# Altium footprint library Package_DFN_QFN.PcbLib: 557 footprints (part 30 of 35)
Each footprint in its own frame and in the unit in brackets; x right, y up, seen from the top. Pads: shape width x height; smd on the part's side, far side on the other; paste and mask are expansions set on the pad; w line width, h text height; cw(c..) or ccw(c..) is an arc to the next point about the centre after c.
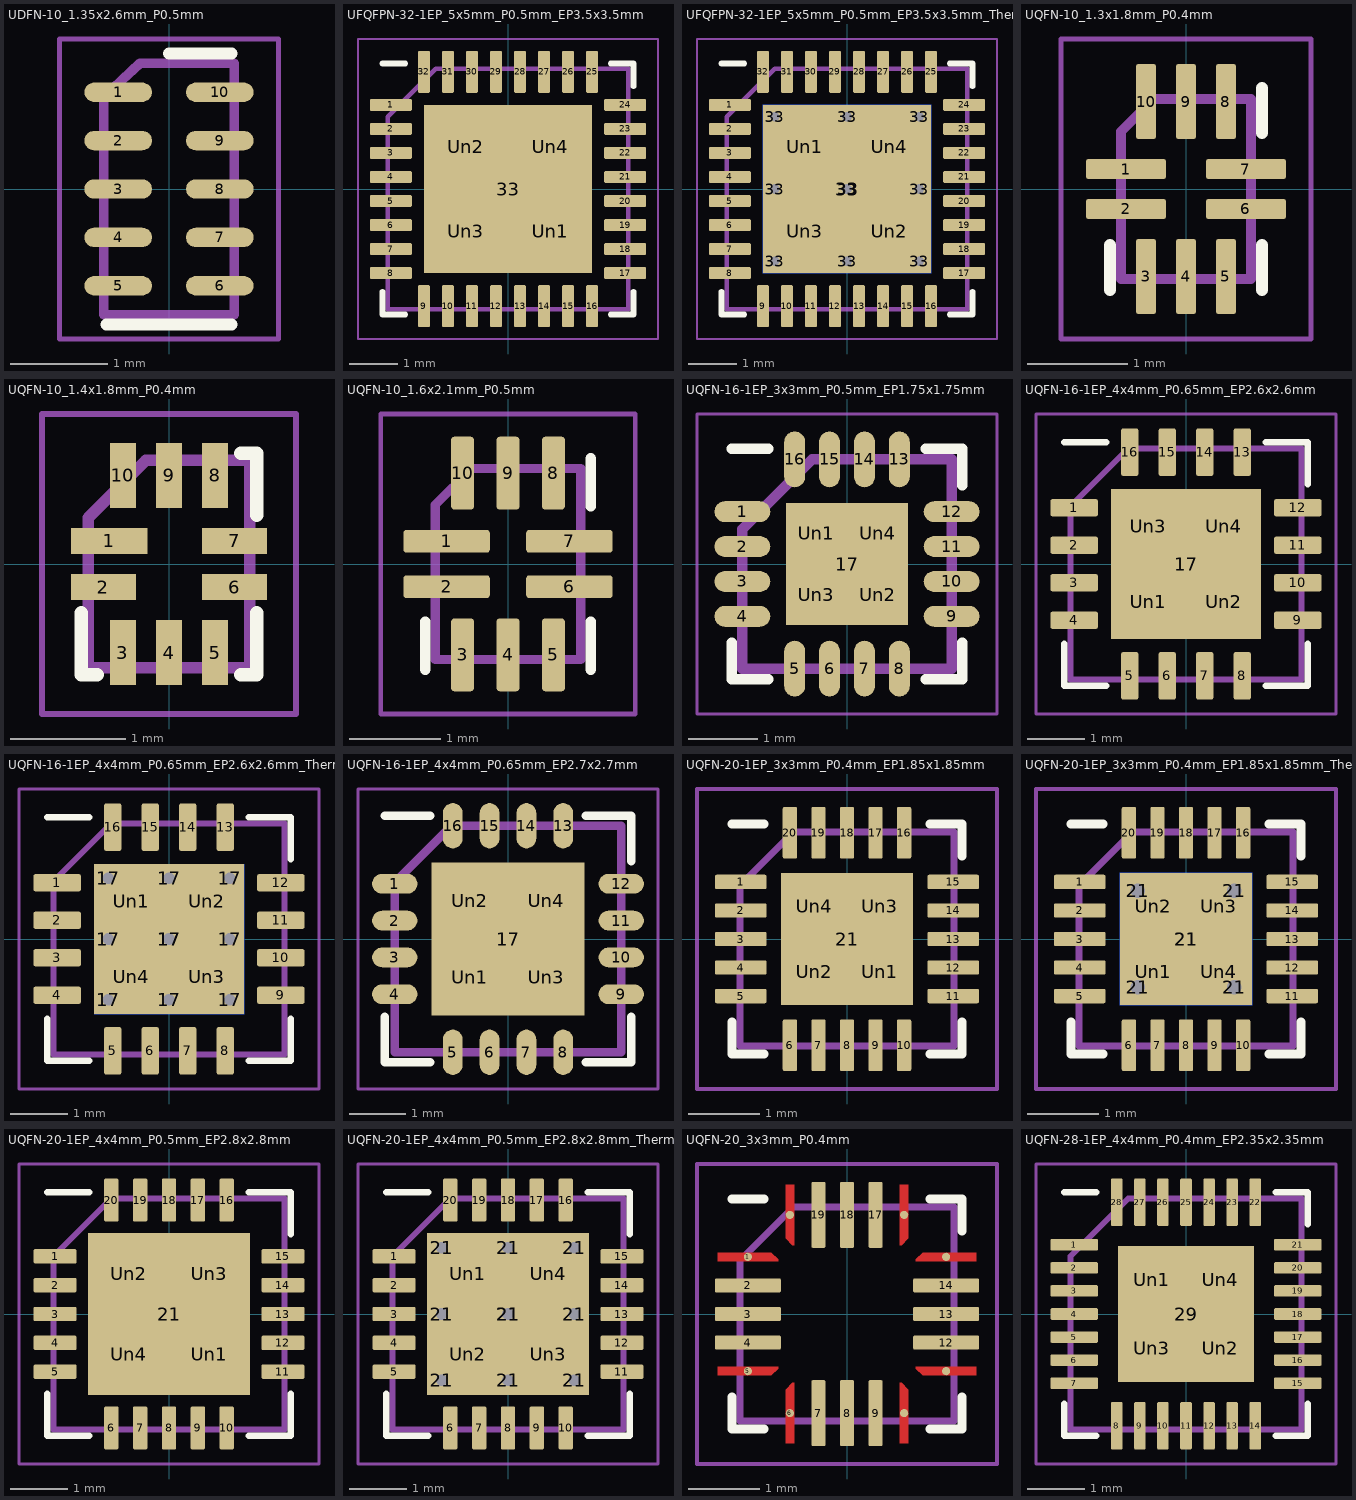
[diagram p29: the footprints below, top view; thin cyan lines are the x and y axes]

## UDFN-10_1.35x2.6mm_P0.5mm [mm]
pads (10):
  rrect100% 0.7x0.2 smd: 1(-0.525,1) 2(-0.525,0.5) 3(-0.525,0) 4(-0.525,-0.5) 5(-0.525,-1) 6(0.525,-1) 7(0.525,-0.5) 8(0.525,0) 9(0.525,0.5) 10(0.525,1)
F.SilkS:
  lines w0.12: -0.65,-1.4 0.65,-1.4 ; 0,1.4 0.65,1.4
F.CrtYd:
  lines w0.05: -1.13,-1.55 1.13,-1.55 1.13,1.55 -1.13,1.55 -1.13,-1.55
F.Fab:
  lines w0.1: -0.675,-1.3 -0.675,0.95 -0.3,1.3 0.675,1.3 0.675,-1.3 -0.675,-1.3
  text "'.Designator'" at 0.42,-2.023 h0.5

## UFQFPN-32-1EP_5x5mm_P0.5mm_EP3.5x3.5mm [mm]
pads (37):
  rrect25% 0.875x0.25 smd: 1(-2.438,1.75) 2(-2.438,1.25) 3(-2.438,0.75) 4(-2.438,0.25) 5(-2.438,-0.25) 6(-2.438,-0.75) 7(-2.438,-1.25) 8(-2.438,-1.75) 17(2.438,-1.75) 18(2.438,-1.25) 19(2.438,-0.75) 20(2.438,-0.25) 21(2.438,0.25) 22(2.438,0.75) 23(2.438,1.25) 24(2.438,1.75)
  rrect25% 0.25x0.875 smd: 9(-1.75,-2.438) 10(-1.25,-2.438) 11(-0.75,-2.438) 12(-0.25,-2.438) 13(0.25,-2.438) 14(0.75,-2.438) 15(1.25,-2.438) 16(1.75,-2.438) 25(1.75,2.438) 26(1.25,2.438) 27(0.75,2.438) 28(0.25,2.438) 29(-0.25,2.438) 30(-0.75,2.438) 31(-1.25,2.438) 32(-1.75,2.438)
  rect 3.5x3.5 smd: 33(0,0)
  rrect18% 1.41x1.41 on Top Paste: Un1(0.875,-0.875) Un2(-0.875,0.875) Un3(-0.875,-0.875) Un4(0.875,0.875)
F.SilkS:
  lines w0.12: -2.61,-2.135 -2.61,-2.61 -2.135,-2.61 ; -2.61,2.61 -2.135,2.61 ; 2.135,-2.61 2.61,-2.61 2.61,-2.135 ; 2.135,2.61 2.61,2.61 2.61,2.135
F.CrtYd:
  lines w0.05: -3.12,-3.12 3.12,-3.12 3.12,3.12 -3.12,3.12 -3.12,-3.12
F.Fab:
  lines w0.1: -2.5,-2.5 2.5,-2.5 2.5,2.5 -1.5,2.5 -2.5,1.5 -2.5,-2.5
  text "'.Designator'" at -4.047,-0.84 h1

## UFQFPN-32-1EP_5x5mm_P0.5mm_EP3.5x3.5mm_ThermalVias [mm]
pads (47):
  rrect25% 0.875x0.25 smd: 1(-2.438,1.75) 2(-2.438,1.25) 3(-2.438,0.75) 4(-2.438,0.25) 5(-2.438,-0.25) 6(-2.438,-0.75) 7(-2.438,-1.25) 8(-2.438,-1.75) 17(2.438,-1.75) 18(2.438,-1.25) 19(2.438,-0.75) 20(2.438,-0.25) 21(2.438,0.25) 22(2.438,0.75) 23(2.438,1.25) 24(2.438,1.75)
  rrect25% 0.25x0.875 smd: 9(-1.75,-2.438) 10(-1.25,-2.438) 11(-0.75,-2.438) 12(-0.25,-2.438) 13(0.25,-2.438) 14(0.75,-2.438) 15(1.25,-2.438) 16(1.75,-2.438) 25(1.75,2.438) 26(1.25,2.438) 27(0.75,2.438) 28(0.25,2.438) 29(-0.25,2.438) 30(-0.75,2.438) 31(-1.25,2.438) 32(-1.75,2.438)
  round 0.5 hole 0.2: 33(-1.5,-1.5) 33(-1.5,0) 33(-1.5,1.5) 33(0,-1.5) 33(0,0) 33(0,1.5) 33(1.5,-1.5) 33(1.5,0) 33(1.5,1.5)
  rect 3.5x3.5 smd: 33(0,0)
  rect 3.5x3.5 smd far side: 33(0,0)
  rrect18% 1.41x1.41 on Top Paste: Un1(-0.875,0.875) Un2(0.875,-0.875) Un3(-0.875,-0.875) Un4(0.875,0.875)
F.SilkS:
  lines w0.12: -2.61,-2.135 -2.61,-2.61 -2.135,-2.61 ; -2.61,2.61 -2.135,2.61 ; 2.135,-2.61 2.61,-2.61 2.61,-2.135 ; 2.135,2.61 2.61,2.61 2.61,2.135
F.CrtYd:
  lines w0.05: -3.12,-3.12 -3.12,3.12 3.12,3.12 3.12,-3.12 -3.12,-3.12
F.Fab:
  lines w0.1: -2.5,-2.5 2.5,-2.5 2.5,2.5 -1.5,2.5 -2.5,1.5 -2.5,-2.5
  text "'.Designator'" at -4.047,-0.84 h1

## UQFN-10_1.3x1.8mm_P0.4mm [mm]
pads (10):
  rrect25% 0.8x0.2 smd: 1(-0.6,0.2) 2(-0.6,-0.2) 6(0.6,-0.2) 7(0.6,0.2)
  rrect25% 0.2x0.75 smd: 3(-0.4,-0.875) 4(0,-0.875) 5(0.4,-0.875) 8(0.4,0.875) 9(0,0.875) 10(-0.4,0.875)
F.SilkS:
  lines w0.12: -0.76,-1.01 -0.76,-0.56 ; 0.76,-1.01 0.76,-0.56 ; 0.76,0.56 0.76,1.01
F.CrtYd:
  lines w0.05: -1.25,-1.5 -1.25,1.5 1.25,1.5 1.25,-1.5 -1.25,-1.5
F.Fab:
  lines w0.1: -0.65,-0.9 0.65,-0.9 0.65,0.9 -0.325,0.9 -0.65,0.575 -0.65,-0.9
  text "'.Designator'" at -1.297,-0.271 h0.32

## UQFN-10_1.4x1.8mm_P0.4mm [mm]
pads (10):
  rect 0.663x0.225 smd: 1(-0.519,0.2)
  rect 0.563x0.225 smd: 2(-0.569,-0.2) 6(0.569,-0.2) 7(0.569,0.2)
  rect 0.225x0.563 smd: 3(-0.4,-0.768) 4(0,-0.768) 5(0.4,-0.768) 8(0.4,0.768) 9(0,0.768) 10(-0.4,0.768)
F.SilkS:
  lines w0.12: -0.76,-0.425 -0.76,-0.96 -0.625,-0.96 ; 0.625,-0.96 0.76,-0.96 0.76,-0.425 ; 0.625,0.96 0.76,0.96 0.76,0.425
F.CrtYd:
  lines w0.05: -1.1,-1.3 -1.1,1.3 1.1,1.3 1.1,-1.3 -1.1,-1.3
F.Fab:
  lines w0.1: -0.7,-0.9 0.7,-0.9 0.7,0.9 -0.2,0.9 -0.7,0.4 -0.7,-0.9
  text "'.Designator'" at -1.998,-0.395 h0.5

## UQFN-10_1.6x2.1mm_P0.5mm [mm]
pads (10):
  rrect25% 0.95x0.25 smd: 1(-0.675,0.25) 2(-0.675,-0.25) 6(0.675,-0.25) 7(0.675,0.25)
  rrect25% 0.25x0.8 smd: 3(-0.5,-1) 4(0,-1) 5(0.5,-1) 8(0.5,1) 9(0,1) 10(-0.5,1)
F.SilkS:
  lines w0.12: -0.91,-1.16 -0.91,-0.635 ; 0.91,-1.16 0.91,-0.635 ; 0.91,0.635 0.91,1.16
F.CrtYd:
  lines w0.05: -1.4,-1.65 1.4,-1.65 1.4,1.65 -1.4,1.65 -1.4,-1.65
F.Fab:
  lines w0.1: -0.8,-1.05 -0.8,0.65 -0.4,1.05 0.8,1.05 0.8,-1.05 -0.8,-1.05
  text "'.Designator'" at -1.619,-0.336 h0.4

## UQFN-16-1EP_3x3mm_P0.5mm_EP1.75x1.75mm [mm]
pads (21):
  rrect100% 0.8x0.3 smd: 1(-1.5,0.75) 2(-1.5,0.25) 3(-1.5,-0.25) 4(-1.5,-0.75) 9(1.5,-0.75) 10(1.5,-0.25) 11(1.5,0.25) 12(1.5,0.75)
  rrect100% 0.3x0.8 smd: 5(-0.75,-1.5) 6(-0.25,-1.5) 7(0.25,-1.5) 8(0.75,-1.5) 13(0.75,1.5) 14(0.25,1.5) 15(-0.25,1.5) 16(-0.75,1.5)
  rect 1.75x1.75 smd: 17(0,0)
  rect 0.7x0.7 on Top Paste: Un1(-0.437,0.437) Un2(0.437,-0.437) Un3(-0.437,-0.437) Un4(0.437,0.437)
F.SilkS:
  lines w0.15: -1.65,-1.125 -1.65,-1.65 -1.125,-1.65 ; -1.65,1.65 -1.125,1.65 ; 1.125,-1.65 1.65,-1.65 1.65,-1.125 ; 1.125,1.65 1.65,1.65 1.65,1.125
F.CrtYd:
  lines w0.05: -2.15,-2.15 2.15,-2.15 2.15,2.15 -2.15,2.15 -2.15,-2.15
F.Fab:
  lines w0.15: -1.5,-1.5 1.5,-1.5 1.5,1.5 -0.5,1.5 -1.5,0.5 -1.5,-1.5
  text "'.Designator'" at -2.833,-0.588 h0.7

## UQFN-16-1EP_4x4mm_P0.65mm_EP2.6x2.6mm [mm]
pads (21):
  rrect25% 0.825x0.3 smd: 1(-1.937,0.975) 2(-1.937,0.325) 3(-1.937,-0.325) 4(-1.937,-0.975) 9(1.937,-0.975) 10(1.937,-0.325) 11(1.937,0.325) 12(1.937,0.975)
  rrect25% 0.3x0.825 smd: 5(-0.975,-1.937) 6(-0.325,-1.937) 7(0.325,-1.937) 8(0.975,-1.937) 13(0.975,1.937) 14(0.325,1.937) 15(-0.325,1.937) 16(-0.975,1.937)
  rect 2.6x2.6 smd: 17(0,0)
  rrect24% 1.05x1.05 on Top Paste: Un1(-0.65,-0.65) Un2(0.65,-0.65) Un3(-0.65,0.65) Un4(0.65,0.65)
F.SilkS:
  lines w0.12: -2.11,-1.385 -2.11,-2.11 -1.385,-2.11 ; -2.11,2.11 -1.385,2.11 ; 1.385,-2.11 2.11,-2.11 2.11,-1.385 ; 1.385,2.11 2.11,2.11 2.11,1.385
F.CrtYd:
  lines w0.05: -2.6,-2.6 2.6,-2.6 2.6,2.6 -2.6,2.6 -2.6,-2.6
F.Fab:
  lines w0.1: -2,-2 -2,1 -1,2 2,2 2,-2 -2,-2
  text "'.Designator'" at -4.047,-0.84 h1

## UQFN-16-1EP_4x4mm_P0.65mm_EP2.6x2.6mm_ThermalVias [mm]
pads (31):
  rrect25% 0.825x0.3 smd: 1(-1.937,0.975) 2(-1.937,0.325) 3(-1.937,-0.325) 4(-1.937,-0.975) 9(1.937,-0.975) 10(1.937,-0.325) 11(1.937,0.325) 12(1.937,0.975)
  rrect25% 0.3x0.825 smd: 5(-0.975,-1.937) 6(-0.325,-1.937) 7(0.325,-1.937) 8(0.975,-1.937) 13(0.975,1.937) 14(0.325,1.937) 15(-0.325,1.937) 16(-0.975,1.937)
  round 0.5 hole 0.2: 17(-1.05,-1.05) 17(-1.05,0) 17(-1.05,1.05) 17(0,-1.05) 17(0,0) 17(0,1.05) 17(1.05,-1.05) 17(1.05,0) 17(1.05,1.05)
  rect 2.6x2.6 smd far side: 17(0,0)
  rect 2.6x2.6 smd: 17(0,0)
  rrect22% 1.13x1.13 on Top Paste: Un1(-0.65,0.65) Un2(0.65,0.65) Un3(0.65,-0.65) Un4(-0.65,-0.65)
F.SilkS:
  lines w0.12: -2.11,-1.385 -2.11,-2.11 -1.385,-2.11 ; -2.11,2.11 -1.385,2.11 ; 1.385,-2.11 2.11,-2.11 2.11,-1.385 ; 1.385,2.11 2.11,2.11 2.11,1.385
F.CrtYd:
  lines w0.05: -2.6,-2.6 2.6,-2.6 2.6,2.6 -2.6,2.6 -2.6,-2.6
F.Fab:
  lines w0.1: -2,-2 2,-2 2,2 -1,2 -2,1 -2,-2
  text "'.Designator'" at -4.047,-0.84 h1

## UQFN-16-1EP_4x4mm_P0.65mm_EP2.7x2.7mm [mm]
pads (21):
  rrect100% 0.8x0.35 smd: 1(-2,0.975) 2(-2,0.325) 3(-2,-0.325) 4(-2,-0.975) 9(2,-0.975) 10(2,-0.325) 11(2,0.325) 12(2,0.975)
  rrect100% 0.35x0.8 smd: 5(-0.975,-2) 6(-0.325,-2) 7(0.325,-2) 8(0.975,-2) 13(0.975,2) 14(0.325,2) 15(-0.325,2) 16(-0.975,2)
  rect 2.7x2.7 smd: 17(0,0)
  rect 1.09x1.09 on Top Paste: Un1(-0.675,-0.675) Un2(-0.675,0.675) Un3(0.675,-0.675) Un4(0.675,0.675)
F.SilkS:
  lines w0.15: -2.175,-1.375 -2.175,-2.175 -1.375,-2.175 ; -2.175,2.175 -1.375,2.175 ; 1.375,-2.175 2.175,-2.175 2.175,-1.375 ; 1.375,2.175 2.175,2.175 2.175,1.375
F.CrtYd:
  lines w0.05: -2.65,-2.65 2.65,-2.65 2.65,2.65 -2.65,2.65 -2.65,-2.65
F.Fab:
  lines w0.15: -2,-2 -2,1 -1,2 2,2 2,-2 -2,-2
  text "'.Designator'" at -4.047,-0.84 h1

## UQFN-20-1EP_3x3mm_P0.4mm_EP1.85x1.85mm [mm]
pads (25):
  rrect25% 0.725x0.2 smd: 1(-1.488,0.8) 2(-1.488,0.4) 3(-1.488,0) 4(-1.488,-0.4) 5(-1.488,-0.8) 11(1.488,-0.8) 12(1.488,-0.4) 13(1.488,0) 14(1.488,0.4) 15(1.488,0.8)
  rrect25% 0.2x0.725 smd: 6(-0.8,-1.488) 7(-0.4,-1.488) 8(0,-1.488) 9(0.4,-1.488) 10(0.8,-1.488) 16(0.8,1.488) 17(0.4,1.488) 18(0,1.488) 19(-0.4,1.488) 20(-0.8,1.488)
  rect 1.85x1.85 smd: 21(0,0)
  rrect25% 0.75x0.75 on Top Paste: Un1(0.46,-0.46) Un2(-0.46,-0.46) Un3(0.46,0.46) Un4(-0.46,0.46)
F.SilkS:
  lines w0.12: -1.61,-1.16 -1.61,-1.61 -1.16,-1.61 ; -1.61,1.61 -1.16,1.61 ; 1.16,-1.61 1.61,-1.61 1.61,-1.16 ; 1.16,1.61 1.61,1.61 1.61,1.16
F.CrtYd:
  lines w0.05: -2.1,-2.1 2.1,-2.1 2.1,2.1 -2.1,2.1 -2.1,-2.1
F.Fab:
  lines w0.1: -1.5,-1.5 1.5,-1.5 1.5,1.5 -0.75,1.5 -1.5,0.75 -1.5,-1.5
  text "'.Designator'" at -3.033,-0.628 h0.75

## UQFN-20-1EP_3x3mm_P0.4mm_EP1.85x1.85mm_ThermalVias [mm]
pads (30):
  rrect25% 0.725x0.2 smd: 1(-1.488,0.8) 2(-1.488,0.4) 3(-1.488,0) 4(-1.488,-0.4) 5(-1.488,-0.8) 11(1.488,-0.8) 12(1.488,-0.4) 13(1.488,0) 14(1.488,0.4) 15(1.488,0.8)
  rrect25% 0.2x0.725 smd: 6(-0.8,-1.488) 7(-0.4,-1.488) 8(0,-1.488) 9(0.4,-1.488) 10(0.8,-1.488) 16(0.8,1.488) 17(0.4,1.488) 18(0,1.488) 19(-0.4,1.488) 20(-0.8,1.488)
  round 0.5 hole 0.2: 21(-0.675,-0.675) 21(-0.675,0.675) 21(0.675,-0.675) 21(0.675,0.675)
  rect 1.85x1.85 smd far side: 21(0,0)
  rect 1.85x1.85 smd: 21(0,0)
  rrect25% 0.8x0.8 on Top Paste: Un1(-0.46,-0.46) Un2(-0.46,0.46) Un3(0.46,0.46) Un4(0.46,-0.46)
F.SilkS:
  lines w0.12: -1.61,-1.16 -1.61,-1.61 -1.16,-1.61 ; -1.61,1.61 -1.16,1.61 ; 1.16,-1.61 1.61,-1.61 1.61,-1.16 ; 1.16,1.61 1.61,1.61 1.61,1.16
F.CrtYd:
  lines w0.05: -2.1,-2.1 2.1,-2.1 2.1,2.1 -2.1,2.1 -2.1,-2.1
F.Fab:
  lines w0.1: -1.5,-1.5 -1.5,0.75 -0.75,1.5 1.5,1.5 1.5,-1.5 -1.5,-1.5
  text "'.Designator'" at -3.033,-0.628 h0.75

## UQFN-20-1EP_4x4mm_P0.5mm_EP2.8x2.8mm [mm]
pads (25):
  rrect25% 0.75x0.25 smd: 1(-1.975,1) 2(-1.975,0.5) 3(-1.975,0) 4(-1.975,-0.5) 5(-1.975,-1) 11(1.975,-1) 12(1.975,-0.5) 13(1.975,0) 14(1.975,0.5) 15(1.975,1)
  rrect25% 0.25x0.75 smd: 6(-1,-1.975) 7(-0.5,-1.975) 8(0,-1.975) 9(0.5,-1.975) 10(1,-1.975) 16(1,1.975) 17(0.5,1.975) 18(0,1.975) 19(-0.5,1.975) 20(-1,1.975)
  rect 2.8x2.8 smd: 21(0,0)
  rrect22% 1.13x1.13 on Top Paste: Un1(0.7,-0.7) Un2(-0.7,0.7) Un3(0.7,0.7) Un4(-0.7,-0.7)
F.SilkS:
  lines w0.12: -2.11,-1.385 -2.11,-2.11 -1.385,-2.11 ; -2.11,2.11 -1.385,2.11 ; 1.385,-2.11 2.11,-2.11 2.11,-1.385 ; 1.385,2.11 2.11,2.11 2.11,1.385
F.CrtYd:
  lines w0.05: -2.6,-2.6 -2.6,2.6 2.6,2.6 2.6,-2.6 -2.6,-2.6
F.Fab:
  lines w0.1: -2,-2 2,-2 2,2 -1,2 -2,1 -2,-2
  text "'.Designator'" at -4.047,-0.84 h1

## UQFN-20-1EP_4x4mm_P0.5mm_EP2.8x2.8mm_ThermalVias [mm]
pads (35):
  rrect25% 0.75x0.25 smd: 1(-1.975,1) 2(-1.975,0.5) 3(-1.975,0) 4(-1.975,-0.5) 5(-1.975,-1) 11(1.975,-1) 12(1.975,-0.5) 13(1.975,0) 14(1.975,0.5) 15(1.975,1)
  rrect25% 0.25x0.75 smd: 6(-1,-1.975) 7(-0.5,-1.975) 8(0,-1.975) 9(0.5,-1.975) 10(1,-1.975) 16(1,1.975) 17(0.5,1.975) 18(0,1.975) 19(-0.5,1.975) 20(-1,1.975)
  round 0.5 hole 0.2: 21(-1.15,-1.15) 21(-1.15,0) 21(-1.15,1.15) 21(0,-1.15) 21(0,0) 21(0,1.15) 21(1.15,-1.15) 21(1.15,0) 21(1.15,1.15)
  rect 2.8x2.8 smd: 21(0,0)
  rect 2.8x2.8 smd far side: 21(0,0)
  rrect21% 1.17x1.17 on Top Paste: Un1(-0.7,0.7) Un2(-0.7,-0.7) Un3(0.7,-0.7) Un4(0.7,0.7)
F.SilkS:
  lines w0.12: -2.11,-1.385 -2.11,-2.11 -1.385,-2.11 ; -2.11,2.11 -1.385,2.11 ; 1.385,-2.11 2.11,-2.11 2.11,-1.385 ; 1.385,2.11 2.11,2.11 2.11,1.385
F.CrtYd:
  lines w0.05: -2.6,-2.6 -2.6,2.6 2.6,2.6 2.6,-2.6 -2.6,-2.6
F.Fab:
  lines w0.1: -2,-2 -2,1 -1,2 2,2 2,-2 -2,-2
  text "'.Designator'" at -4.047,-0.84 h1

## UQFN-20_3x3mm_P0.4mm [mm]
pads (20):
  round 0.115 smd: 1(-1.388,0.8) 5(-1.388,-0.8) 6(-0.8,-1.388) 10(0.8,-1.388) 11(1.388,-0.8) 15(1.388,0.8) 16(0.8,1.388) 20(-0.8,1.388)
  rrect25% 0.925x0.2 smd: 2(-1.388,0.4) 3(-1.388,0) 4(-1.388,-0.4) 12(1.388,-0.4) 13(1.388,0) 14(1.388,0.4)
  rrect25% 0.2x0.925 smd: 7(-0.4,-1.388) 8(0,-1.388) 9(0.4,-1.388) 17(0.4,1.388) 18(0,1.388) 19(-0.4,1.388)
F.Cu:
  region: -0.965,0.763 -0.965,0.74 -1.81,0.74 -1.81,0.86 -1.062,0.86
  region: -0.965,-0.763 -1.062,-0.86 -1.81,-0.86 -1.81,-0.74 -0.965,-0.74
  region: -0.74,-1.81 -0.86,-1.81 -0.86,-1.062 -0.763,-0.965 -0.74,-0.965
  region: 0.86,-1.062 0.86,-1.81 0.74,-1.81 0.74,-0.965 0.763,-0.965
  region: 1.81,-0.86 1.062,-0.86 0.965,-0.763 0.965,-0.74 1.81,-0.74
  region: 1.81,0.74 0.965,0.74 0.965,0.763 1.062,0.86 1.81,0.86
  region: 0.86,1.062 0.763,0.965 0.74,0.965 0.74,1.81 0.86,1.81
  region: -0.74,0.965 -0.763,0.965 -0.86,1.062 -0.86,1.81 -0.74,1.81
F.SilkS:
  lines w0.12: -1.61,-1.16 -1.61,-1.61 -1.16,-1.61 ; -1.61,1.61 -1.16,1.61 ; 1.16,-1.61 1.61,-1.61 1.61,-1.16 ; 1.16,1.61 1.61,1.61 1.61,1.16
F.Paste:
  region: -0.965,0.763 -0.965,0.74 -1.81,0.74 -1.81,0.86 -1.062,0.86
  region: -0.965,-0.763 -1.062,-0.86 -1.81,-0.86 -1.81,-0.74 -0.965,-0.74
  region: -0.74,-1.81 -0.86,-1.81 -0.86,-1.062 -0.763,-0.965 -0.74,-0.965
  region: 0.86,-1.062 0.86,-1.81 0.74,-1.81 0.74,-0.965 0.763,-0.965
  region: 1.81,-0.86 1.062,-0.86 0.965,-0.763 0.965,-0.74 1.81,-0.74
  region: 1.81,0.74 0.965,0.74 0.965,0.763 1.062,0.86 1.81,0.86
  region: 0.86,1.062 0.763,0.965 0.74,0.965 0.74,1.81 0.86,1.81
  region: -0.74,0.965 -0.763,0.965 -0.86,1.062 -0.86,1.81 -0.74,1.81
F.Mask:
  region: -0.965,0.763 -0.965,0.74 -1.81,0.74 -1.81,0.86 -1.062,0.86
  region: -0.965,-0.763 -1.062,-0.86 -1.81,-0.86 -1.81,-0.74 -0.965,-0.74
  region: -0.74,-1.81 -0.86,-1.81 -0.86,-1.062 -0.763,-0.965 -0.74,-0.965
  region: 0.86,-1.062 0.86,-1.81 0.74,-1.81 0.74,-0.965 0.763,-0.965
  region: 1.81,-0.86 1.062,-0.86 0.965,-0.763 0.965,-0.74 1.81,-0.74
  region: 1.81,0.74 0.965,0.74 0.965,0.763 1.062,0.86 1.81,0.86
  region: 0.86,1.062 0.763,0.965 0.74,0.965 0.74,1.81 0.86,1.81
  region: -0.74,0.965 -0.763,0.965 -0.86,1.062 -0.86,1.81 -0.74,1.81
F.CrtYd:
  lines w0.05: -2.1,-2.1 -2.1,2.1 2.1,2.1 2.1,-2.1 -2.1,-2.1
F.Fab:
  lines w0.1: -1.5,-1.5 1.5,-1.5 1.5,1.5 -0.75,1.5 -1.5,0.75 -1.5,-1.5
  text "'.Designator'" at -3.033,-0.628 h0.75

## UQFN-28-1EP_4x4mm_P0.4mm_EP2.35x2.35mm [mm]
pads (33):
  rrect25% 0.825x0.2 smd: 1(-1.937,1.2) 2(-1.937,0.8) 3(-1.937,0.4) 4(-1.937,0) 5(-1.937,-0.4) 6(-1.937,-0.8) 7(-1.937,-1.2) 15(1.937,-1.2) 16(1.937,-0.8) 17(1.937,-0.4) 18(1.937,0) 19(1.937,0.4) 20(1.937,0.8) 21(1.937,1.2)
  rrect25% 0.2x0.825 smd: 8(-1.2,-1.937) 9(-0.8,-1.937) 10(-0.4,-1.937) 11(0,-1.937) 12(0.4,-1.937) 13(0.8,-1.937) 14(1.2,-1.937) 22(1.2,1.937) 23(0.8,1.937) 24(0.4,1.937) 25(0,1.937) 26(-0.4,1.937) 27(-0.8,1.937) 28(-1.2,1.937)
  rect 2.35x2.35 smd: 29(0,0)
  rrect25% 0.95x0.95 on Top Paste: Un1(-0.59,0.59) Un2(0.59,-0.59) Un3(-0.59,-0.59) Un4(0.59,0.59)
F.SilkS:
  lines w0.12: -2.11,-1.56 -2.11,-2.11 -1.56,-2.11 ; -2.11,2.11 -1.56,2.11 ; 1.56,-2.11 2.11,-2.11 2.11,-1.56 ; 1.56,2.11 2.11,2.11 2.11,1.56
F.CrtYd:
  lines w0.05: -2.6,-2.6 2.6,-2.6 2.6,2.6 -2.6,2.6 -2.6,-2.6
F.Fab:
  lines w0.1: -2,-2 2,-2 2,2 -1,2 -2,1 -2,-2
  text "'.Designator'" at -4.047,-0.84 h1